# Altium footprint library MyPcbLib.PcbLib: 87 footprints (part 4 of 6)
Each footprint in its own frame and in the unit in brackets; x right, y up, seen from the top. Pads: shape width x height; smd on the part's side, far side on the other; paste and mask are expansions set on the pad; w line width, h text height; cw(c..) or ccw(c..) is an arc to the next point about the centre after c.
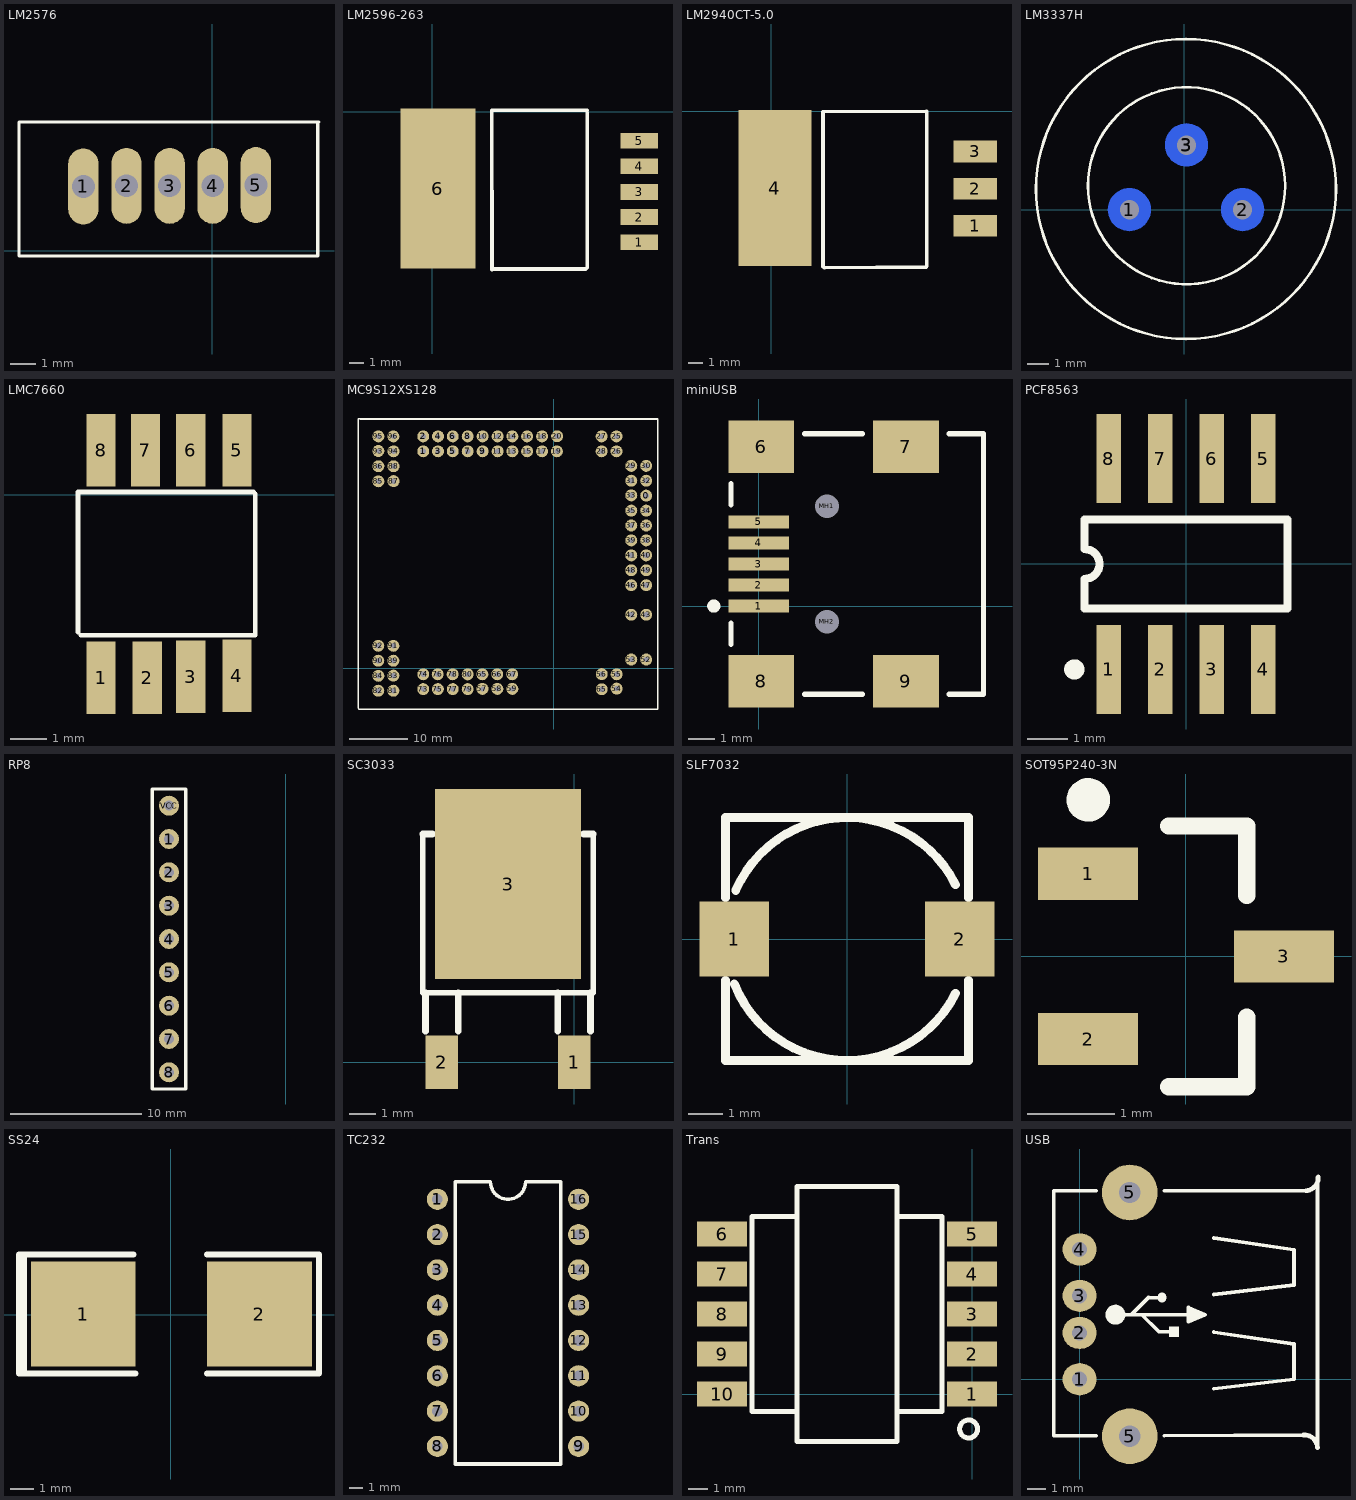
[diagram p3: the footprints below, top view; thin cyan lines are the x and y axes]

## LM2576 [mm]
pads (5):
  oval 1.2x3 hole 0.9: 1(-5.08,2.54) 2(-3.378,2.565) 3(-1.676,2.565) 4(0.025,2.565) 5(1.727,2.591)
Top Overlay:
  lines w0.127: 4.166,5.029 4.166,-0.203 -7.62,-0.203 -7.62,5.08 4.216,5.08

## LM2596-263 [mil]
pads (6):
  rect 100x42 smd: 1(550,-347) 2(550,-280) 3(550,-213) 4(550,-145) 5(550,-77)
  rect 200x425 smd: 6(15,-204)
Top Overlay:
  lines w10: 158,4 159,-419 ; 159,4 412,4 ; 161,-418 407,-418 ; 412,-414 412,-2

## LM2940CT-5.0 [mil]
pads (4):
  rect 118.11x59.06 smd: 1(556,-311) 2(556,-211) 3(556,-109)
  rect 200x425 smd: 4(10,-209)
Top Overlay:
  lines w10: 141,-423 141,-1 422,1 ; 145,-426 422,-424 ; 424,-422 424,1

## LM3337H [mm]
pads (4):
  round 2 on Bottom hole 0.9: 1(-2.565,0) 2(2.718,0) 3(0.102,3.023)
  round 2 on Bottom Paste hole 0.9: 3(0.102,2.997)
Top Overlay:
  circle w0.127: c0.102,1.118 r4.6
  circle w0.127: c0.076,0.965 r7

## LMC7660 [mil]
pads (8):
  rect 31.5x78.74 smd: 1(126,-198) 2(176,-198) 3(223,-197) 4(273,-196) 5(273,48) 6(223,48) 7(174,48) 8(126,48)
Top Overlay:
  lines w5: 101,-149 101,3 291,3 ; 104,-152 293,-152 293,1

## MC9S12XS128 [mil]
pads (80):
  round 80 hole 35: 0(620,1155) 1(-874,1452) 2(-874,1552) 3(-775,1452) 4(-775,1552) 5(-676,1452) 6(-676,1552) 7(-576,1452) 8(-576,1552) 9(-476,1452) 10(-476,1552) 11(-376,1452) 12(-376,1552) 13(-277,1452) 14(-277,1552) 15(-178,1452) 16(-178,1552) 17(-78,1452) 18(-78,1552) 19(22,1452) 20(23,1553) 25(421,1552) 26(421,1452) 27(321,1552) 28(321,1452) 29(520,1354) 30(620,1354) 31(520,1255) 32(620,1255) 33(520,1157) 34(620,1055) 35(520,1055) 36(620,955) 37(520,955) 38(620,855) 39(520,855) 40(620,755) 41(520,755) 42(520,357) 43(620,357) 46(520,555) 47(620,555) 48(520,655) 49(620,655) 52(620,57) 53(520,57) 54(422,-138) 55(422,-42) 56(322,-41) 57(-477,-140) 58(-377,-140) 59(-277,-140) 65(-478,-42) 65(322,-142) 66(-378,-42) 67(-278,-42) 73(-874,-141) 74(-874,-42) 75(-776,-141) 76(-777,-42) 77(-676,-141) 78(-677,-42) 79(-576,-141) 80(-576,-43) 81(-1074,-152) 82(-1175,-152) 83(-1074,-51) 84(-1174,-52) 85(-1174,1251) 86(-1174,1352) 87(-1073,1252) 88(-1073,1352) 89(-1074,49) 90(-1175,49) 91(-1074,149) 92(-1175,149) 93(-1174,1454) 94(-1073,1452) 95(-1174,1552) 96(-1074,1552)
Top Overlay:
  lines w10: -1296.02,1666 699,1666 ; -1311.02,-269.98 -1305,-276 696,-276 697,-275 697,1667 694,1670 -1311,1670 -1311,1660.02 -1311.02,-269.98

## miniUSB [mm] "Connector; USB2.0, Type B, SM; 5 Position; Right Angle"
height 3.9
pads (11):
  rect 2.3x0.5 smd: 1(0,0) 2(0,0.8) 3(0,1.6) 4(0,2.4) 5(0,3.2)
  rect 2.5x2 smd: 6(0.1,6.05) 7(5.6,6.05) 8(0.1,-2.85) 9(5.6,-2.85)
  round 0.6 hole 0.9 unplated: MH1(2.6,3.8) MH2(2.6,-0.6)
Top Overlay:
  circle w0.25: c-1.7,0 r0.125
  lines w0.2: -1.05,-1.45 -1.05,-0.65 ; -1.05,3.85 -1.05,4.65 ; 1.75,-3.35 3.95,-3.35 ; 1.75,6.55 3.95,6.55 ; 7.25,-3.35 8.55,-3.35 8.55,6.55 7.25,6.55

## PCF8563 [mm] "Small Outline; 8 Leads; Body Width 3.9 mm; Pitch 1.27 mm"
height 1.75
pads (8):
  rect 0.6x2.2 smd: 1(-1.905,-2.6) 2(-0.635,-2.6) 3(0.635,-2.6) 4(1.905,-2.6) 5(1.905,2.6) 6(0.635,2.6) 7(-0.635,2.6) 8(-1.905,2.6)
Top Overlay:
  circle w0.25: c-2.755,-2.6 r0.125
  lines w0.2: -2.5,-1.1 2.5,-1.1 2.5,1.1 -2.5,1.1 -2.5,0.367 cw(c-2.5,0) -2.5,-0.367 -2.5,-1.1

## RP8 [mil]
pads (9):
  round 60 hole 30: 1(-350,-950) 2(-350,-1050) 3(-350,-1150) 4(-350,-1250) 5(-350,-1350) 6(-350,-1450) 7(-350,-1550) 8(-350,-1650) VCC(-350,-850)
Top Overlay:
  lines w10: -400,-1700 -300,-1700 -300,-800 -400,-800 -400,-1700

## SC3033 [mm]
pads (3):
  rect 1.25x2.05 smd: 1(0,0) 2(-5.08,0)
  rect 5.6x7.3 smd: 3(-2.54,6.85)
Top Overlay:
  lines w0.203: -5.81,8.77 -5.81,2.67 0.73,2.67 0.73,8.77
  lines w0.254: -5.81,8.77 -5.44,8.77 ; -5.71,1.194 -5.71,2.67 ; -4.45,1.194 -4.45,2.67 ; -0.63,1.194 -0.63,2.67 ; 0.36,8.77 0.73,8.77 ; 0.63,1.194 0.63,2.67

## SLF7032 [mm]
height 2.54
pads (2):
  rect 2x2.15 smd: 1(-3.25,0) 2(3.25,0)
Top Overlay:
  lines w0.254: -3.5,-1.2 -3.5,-3.5 3.5,-3.5 3.5,-1.2 ; -3.5,1.2 -3.5,3.5 3.5,3.5 3.5,1.2 ; -3.25,-1.3 ccw(c0,0) 3.13,-1.565 ; -3.209,1.397 cw(c0,0) 3.13,1.565

## SOT95P240-3N [mm] "SOT23, 3-Leads, Body 2.9x1.3mm, Pitch 0.95mm, Lead Span 2.4mm, IPC Medium Density"
height 1.14
pads (3):
  rect 1.15x0.6 smd: 1(-1.125,0.95) 2(-1.125,-0.95) 3(1.125,0)
Top Overlay:
  circle w0.25: c-1.125,1.8 r0.125
  lines w0.2: -0.2,-1.5 0.7,-1.5 0.7,-0.7 ; -0.2,1.5 0.7,1.5 0.7,0.7

## SS24 [mm]
pads (2):
  rect 4.4x4.4 smd: 1(-3.68,0.028) 2(3.72,0.028)
Top Overlay:
  lines w0.254: -5.78,-2.472 -6.38,-2.472 -6.38,2.528 -5.48,2.528 ; -1.58,2.528 -6.18,2.528 -6.18,-2.472 -1.48,-2.472 ; 1.52,-2.472 6.22,-2.472 6.22,2.528 1.52,2.528

## TC232 [mil]
pads (16):
  round 60 hole 30: 1(-35750,-29950) 2(-35750,-30050) 3(-35750,-30150) 4(-35750,-30250) 5(-35750,-30350) 6(-35750,-30450) 7(-35750,-30550) 8(-35750,-30650) 9(-35350,-30650) 10(-35350,-30550) 11(-35350,-30450) 12(-35350,-30350) 13(-35350,-30250) 14(-35350,-30150) 15(-35350,-30050) 16(-35350,-29950)
Top Overlay:
  lines w10: -35700,-30700 -35400,-30700 -35400,-29900 -35500,-29900 cw(c-35550,-29900) -35600,-29900 -35700,-29900 -35700,-30700

## Trans [mil]
pads (10):
  rect 100x50 smd: 1(0,0) 2(0,80) 3(0,160) 4(0,240) 5(0,320) 6(-500,320) 7(-500,240) 8(-500,160) 9(-500,80) 10(-500,0)
Top Overlay:
  circle w10: c-6.97,-70 r18.03
  lines w10: -350,-35 -440,-35 -440,355 -350,355 ; -150,-35 -60,-35 -60,355 -150,355 ; -350,-95 -350,415 -150,415 -150,-95 -350,-95

## USB [mil]
pads (6):
  oval 72x68 hole 32.29: 1(0,0) 2(0,98.43) 3(0,177.17) 4(0,275.59)
  round 118.11 hole 45: 5(106.69,-120.87) 5(106.69,396.46)
Top Overlay:
  circle w20: c76,137 r11.18
  region: 211,90 211,112 190,112 190,90
  lines w8: 35,-120 -55,-120 -55,400 35,400 ; 76,137 266,137 ; 110.27,137.27 146.27,173.27 ; 132,137 168,101 191,101 ; 147,173 166,173 ; 150,137 151,137 ; 180,-120 475,-118.19 ; 180,400 480,400 ; 285,-20 455,0 455,75 285,100 ; 285,180 455,200 455,275 285,300 ; 505,-145 505,428.19 ; 266,137 231,152 231,122 266,137
  lines w10: 475,-118.19 cw(c476.59,-146.59) 505,-145 ; 480,400 ccw(c478.41,428.41) 506.81,430
  lines w20: 175,173 175,174 ; 236,137 251,137